# Altium footprint library IC.PCBLIB: 359 footprints (part 2 of 23) (continued)
## BGA208X17-0.8-TF [mil] (continued)
TopOverlay:
  circle w9.84: c-68.9,0 r4.92
  lines w3.94: 232.28,-251.97 271.65,-251.97 ; 251.97,-271.65 251.97,-232.28
  lines w7.87: -43.31,3.94 -3.94,43.31 ; -43.31,-547.24 547.24,-547.24 547.24,43.31 -43.31,43.31 -43.31,-547.24

## BGA256X16-1.0 [mil]
height 50
pads (256):
  round 20 smd: A1(0,0) A2(39.37,0) A3(78.74,0) A4(118.11,0) A5(157.48,0) A6(196.85,0) A7(236.22,0) A8(275.59,0) A9(314.96,0) A10(354.33,0) A11(393.7,0) A12(433.07,0) A13(472.44,0) A14(511.81,0) A15(551.18,0) A16(590.55,0) B1(0,-39.37) B2(39.37,-39.37) B3(78.74,-39.37) B4(118.11,-39.37) B5(157.48,-39.37) B6(196.85,-39.37) B7(236.22,-39.37) B8(275.59,-39.37) B9(314.96,-39.37) B10(354.33,-39.37) B11(393.7,-39.37) B12(433.07,-39.37) B13(472.44,-39.37) B14(511.81,-39.37) B15(551.18,-39.37) B16(590.55,-39.37) C1(0,-78.74) C2(39.37,-78.74) C3(78.74,-78.74) C4(118.11,-78.74) C5(157.48,-78.74) C6(196.85,-78.74) C7(236.22,-78.74) C8(275.59,-78.74) C9(314.96,-78.74) C10(354.33,-78.74) C11(393.7,-78.74) C12(433.07,-78.74) C13(472.44,-78.74) C14(511.81,-78.74) C15(551.18,-78.74) C16(590.55,-78.74) D1(0,-118.11) D2(39.37,-118.11) D3(78.74,-118.11) D4(118.11,-118.11) D5(157.48,-118.11) D6(196.85,-118.11) D7(236.22,-118.11) D8(275.59,-118.11) D9(314.96,-118.11) D10(354.33,-118.11) D11(393.7,-118.11) D12(433.07,-118.11) D13(472.44,-118.11) D14(511.81,-118.11) D15(551.18,-118.11) D16(590.55,-118.11) E1(0,-157.48) E2(39.37,-157.48) E3(78.74,-157.48) E4(118.11,-157.48) E5(157.48,-157.48) E6(196.85,-157.48) E7(236.22,-157.48) E8(275.59,-157.48) E9(314.96,-157.48) E10(354.33,-157.48) E11(393.7,-157.48) E12(433.07,-157.48) E13(472.44,-157.48) E14(511.81,-157.48) E15(551.18,-157.48) E16(590.55,-157.48) F1(0,-196.85) F2(39.37,-196.85) F3(78.74,-196.85) F4(118.11,-196.85) F5(157.48,-196.85) F6(196.85,-196.85) F7(236.22,-196.85) F8(275.59,-196.85) F9(314.96,-196.85) F10(354.33,-196.85) F11(393.7,-196.85) F12(433.07,-196.85) F13(472.44,-196.85) F14(511.81,-196.85) F15(551.18,-196.85) F16(590.55,-196.85) G1(0,-236.22) G2(39.37,-236.22) G3(78.74,-236.22) G4(118.11,-236.22) G5(157.48,-236.22) G6(196.85,-236.22) G7(236.22,-236.22) G8(275.59,-236.22) G9(314.96,-236.22) G10(354.33,-236.22) G11(393.7,-236.22) G12(433.07,-236.22) G13(472.44,-236.22) G14(511.81,-236.22) G15(551.18,-236.22) G16(590.55,-236.22) H1(0,-275.59) H2(39.37,-275.59) H3(78.74,-275.59) H4(118.11,-275.59) H5(157.48,-275.59) H6(196.85,-275.59) H7(236.22,-275.59) H8(275.59,-275.59) H9(314.96,-275.59) H10(354.33,-275.59) H11(393.7,-275.59) H12(433.07,-275.59) H13(472.44,-275.59) H14(511.81,-275.59) H15(551.18,-275.59) H16(590.55,-275.59) J1(0,-314.96) J2(39.37,-314.96) J3(78.74,-314.96) J4(118.11,-314.96) J5(157.48,-314.96) J6(196.85,-314.96) J7(236.22,-314.96) J8(275.59,-314.96) J9(314.96,-314.96) J10(354.33,-314.96) J11(393.7,-314.96) J12(433.07,-314.96) J13(472.44,-314.96) J14(511.81,-314.96) J15(551.18,-314.96) J16(590.55,-314.96) K1(0,-354.33) K2(39.37,-354.33) K3(78.74,-354.33) K4(118.11,-354.33) K5(157.48,-354.33) K6(196.85,-354.33) K7(236.22,-354.33) K8(275.59,-354.33) K9(314.96,-354.33) K10(354.33,-354.33) K11(393.7,-354.33) K12(433.07,-354.33) K13(472.44,-354.33) K14(511.81,-354.33) K15(551.18,-354.33) K16(590.55,-354.33) L1(0,-393.7) L2(39.37,-393.7) L3(78.74,-393.7) L4(118.11,-393.7) L5(157.48,-393.7) L6(196.85,-393.7) L7(236.22,-393.7) L8(275.59,-393.7) L9(314.96,-393.7) L10(354.33,-393.7) L11(393.7,-393.7) L12(433.07,-393.7) L13(472.44,-393.7) L14(511.81,-393.7) L15(551.18,-393.7) L16(590.55,-393.7) M1(0,-433.07) M2(39.37,-433.07) M3(78.74,-433.07) M4(118.11,-433.07) M5(157.48,-433.07) M6(196.85,-433.07) M7(236.22,-433.07) M8(275.59,-433.07) M9(314.96,-433.07) M10(354.33,-433.07) M11(393.7,-433.07) M12(433.07,-433.07) M13(472.44,-433.07) M14(511.81,-433.07) M15(551.18,-433.07) M16(590.55,-433.07) N1(0,-472.44) N2(39.37,-472.44) N3(78.74,-472.44) N4(118.11,-472.44) N5(157.48,-472.44) N6(196.85,-472.44) N7(236.22,-472.44) N8(275.59,-472.44) N9(314.96,-472.44) N10(354.33,-472.44) N11(393.7,-472.44) N12(433.07,-472.44) N13(472.44,-472.44) N14(511.81,-472.44) N15(551.18,-472.44) N16(590.55,-472.44) P1(0,-511.81) P2(39.37,-511.81) P3(78.74,-511.81) P4(118.11,-511.81) P5(157.48,-511.81) P6(196.85,-511.81) P7(236.22,-511.81) P8(275.59,-511.81) P9(314.96,-511.81) P10(354.33,-511.81) P11(393.7,-511.81) P12(433.07,-511.81) P13(472.44,-511.81) P14(511.81,-511.81) P15(551.18,-511.81) P16(590.55,-511.81) R1(0,-551.18) R2(39.37,-551.18) R3(78.74,-551.18) R4(118.11,-551.18) R5(157.48,-551.18) R6(196.85,-551.18) R7(236.22,-551.18) R8(275.59,-551.18) R9(314.96,-551.18) R10(354.33,-551.18) R11(393.7,-551.18) R12(433.07,-551.18) R13(472.44,-551.18) R14(511.81,-551.18) R15(551.18,-551.18) R16(590.55,-551.18) T1(0,-590.55) T2(39.37,-590.55) T3(78.74,-590.55) T4(118.11,-590.55) T5(157.48,-590.55) T6(196.85,-590.55) T7(236.22,-590.55) T8(275.59,-590.55) T9(314.96,-590.55) T10(354.33,-590.55) T11(393.7,-590.55) T12(433.07,-590.55) T13(472.44,-590.55) T14(511.81,-590.55) T15(551.18,-590.55) T16(590.55,-590.55)
TopOverlay:
  lines w8: -65,-590 -50,-590 ; 0,-655 0,-640 ; 0,50 0,70 ; 590,50 590,65 ; 590.55,-660 590.55,-640 ; 645,-590.55 660,-590.55 ; 645,0 660,0
  lines w10: -100,0 -53,0 ; -74,-13 -53,0 ; -74,13 -53,0 ; -39.37,-629.92 629.92,-629.92 629.92,39.37 -19.68,39.37 -39.37,19.68 -39.37,-629.92

## BGA272X17-0.8 [mm]
height 1.27
pads (272):
  round 0.45 smd: A1(0,0) A2(0.8,0) A3(1.6,0) A4(2.4,0) A5(3.2,0) A6(4,0) A7(4.8,0) A8(5.6,0) A9(6.4,0) A10(7.2,0) A11(8,0) A12(8.8,0) A13(9.6,0) A14(10.4,0) A15(11.2,0) A16(12,0) A17(12.8,0) B1(0,-0.8) B2(0.8,-0.8) B3(1.6,-0.8) B4(2.4,-0.8) B5(3.2,-0.8) B6(4,-0.8) B7(4.8,-0.8) B8(5.6,-0.8) B9(6.4,-0.8) B10(7.2,-0.8) B11(8,-0.8) B12(8.8,-0.8) B13(9.6,-0.8) B14(10.4,-0.8) B15(11.2,-0.8) B16(12,-0.8) B17(12.8,-0.8) C1(0,-1.6) C2(0.8,-1.6) C3(1.6,-1.6) C4(2.4,-1.6) C5(3.2,-1.6) C6(4,-1.6) C7(4.8,-1.6) C8(5.6,-1.6) C9(6.4,-1.6) C10(7.2,-1.6) C11(8,-1.6) C12(8.8,-1.6) C13(9.6,-1.6) C14(10.4,-1.6) C15(11.2,-1.6) C16(12,-1.6) C17(12.8,-1.6) D1(0,-2.4) D2(0.8,-2.4) D3(1.6,-2.4) D4(2.4,-2.4) D5(3.2,-2.4) D6(4,-2.4) D7(4.8,-2.4) D8(5.6,-2.4) D9(6.4,-2.4) D10(7.2,-2.4) D11(8,-2.4) D12(8.8,-2.4) D13(9.6,-2.4) D14(10.4,-2.4) D15(11.2,-2.4) D16(12,-2.4) D17(12.8,-2.4) E1(0,-3.2) E2(0.8,-3.2) E3(1.6,-3.2) E4(2.4,-3.2) E5(3.2,-3.2) E6(4,-3.2) E7(4.8,-3.2) E8(5.6,-3.2) E9(6.4,-3.2) E10(7.2,-3.2) E11(8,-3.2) E12(8.8,-3.2) E13(9.6,-3.2) E14(10.4,-3.2) E15(11.2,-3.2) E16(12,-3.2) E17(12.8,-3.2) F1(0,-4) F2(0.8,-4) F3(1.6,-4) F4(2.4,-4) F5(3.2,-4) F6(4,-4) F7(4.8,-4) F8(5.6,-4) F9(6.4,-4) F10(7.2,-4) F11(8,-4) F12(8.8,-4) F13(9.6,-4) F14(10.4,-4) F15(11.2,-4) F16(12,-4) F17(12.8,-4) G1(0,-4.8) G2(0.8,-4.8) G3(1.6,-4.8) G4(2.4,-4.8) G5(3.2,-4.8) G6(4,-4.8) G7(4.8,-4.8) G9(6.4,-4.8) G11(8,-4.8) G12(8.8,-4.8) G13(9.6,-4.8) G14(10.4,-4.8) G15(11.2,-4.8) G16(12,-4.8) G17(12.8,-4.8) H1(0,-5.6) H2(0.8,-5.6) H3(1.6,-5.6) H4(2.4,-5.6) H5(3.2,-5.6) H6(4,-5.6) H12(8.8,-5.6) H13(9.6,-5.6) H14(10.4,-5.6) H15(11.2,-5.6) H16(12,-5.6) H17(12.8,-5.6) J1(0,-6.4) J2(0.8,-6.4) J3(1.6,-6.4) J4(2.4,-6.4) J5(3.2,-6.4) J6(4,-6.4) J7(4.8,-6.4) J11(8,-6.4) J12(8.8,-6.4) J13(9.6,-6.4) J14(10.4,-6.4) J15(11.2,-6.4) J16(12,-6.4) J17(12.8,-6.4) K1(0,-7.2) K2(0.8,-7.2) K3(1.6,-7.2) K4(2.4,-7.2) K5(3.2,-7.2) K6(4,-7.2) K12(8.8,-7.2) K13(9.6,-7.2) K14(10.4,-7.2) K15(11.2,-7.2) K16(12,-7.2) K17(12.8,-7.2) L1(0,-8) L2(0.8,-8) L3(1.6,-8) L4(2.4,-8) L5(3.2,-8) L6(4,-8) L7(4.8,-8) L9(6.4,-8) L11(8,-8) L12(8.8,-8) L13(9.6,-8) L14(10.4,-8) L15(11.2,-8) L16(12,-8) L17(12.8,-8) M1(0,-8.8) M2(0.8,-8.8) M3(1.6,-8.8) M4(2.4,-8.8) M5(3.2,-8.8) M6(4,-8.8) M7(4.8,-8.8) M8(5.6,-8.8) M9(6.4,-8.8) M10(7.2,-8.8) M11(8,-8.8) M12(8.8,-8.8) M13(9.6,-8.8) M14(10.4,-8.8) M15(11.2,-8.8) M16(12,-8.8) M17(12.8,-8.8) N1(0,-9.6) N2(0.8,-9.6) N3(1.6,-9.6) N4(2.4,-9.6) N5(3.2,-9.6) N6(4,-9.6) N7(4.8,-9.6) N8(5.6,-9.6) N9(6.4,-9.6) N10(7.2,-9.6) N11(8,-9.6) N12(8.8,-9.6) N13(9.6,-9.6) N14(10.4,-9.6) N15(11.2,-9.6) N16(12,-9.6) N17(12.8,-9.6) P1(0,-10.4) P2(0.8,-10.4) P3(1.6,-10.4) P4(2.4,-10.4) P5(3.2,-10.4) P6(4,-10.4) P7(4.8,-10.4) P8(5.6,-10.4) P9(6.4,-10.4) P10(7.2,-10.4) P11(8,-10.4) P12(8.8,-10.4) P13(9.6,-10.4) P14(10.4,-10.4) P15(11.2,-10.4) P16(12,-10.4) P17(12.8,-10.4) R1(0,-11.2) R2(0.8,-11.2) R3(1.6,-11.2) R4(2.4,-11.2) R5(3.2,-11.2) R6(4,-11.2) R7(4.8,-11.2) R8(5.6,-11.2) R9(6.4,-11.2) R10(7.2,-11.2) R11(8,-11.2) R12(8.8,-11.2) R13(9.6,-11.2) R14(10.4,-11.2) R15(11.2,-11.2) R16(12,-11.2) R17(12.8,-11.2) T1(0,-12) T2(0.8,-12) T3(1.6,-12) T4(2.4,-12) T5(3.2,-12) T6(4,-12) T7(4.8,-12) T8(5.6,-12) T9(6.4,-12) T10(7.2,-12) T11(8,-12) T12(8.8,-12) T13(9.6,-12) T14(10.4,-12) T15(11.2,-12) T16(12,-12) T17(12.8,-12) U1(0,-12.8) U2(0.8,-12.8) U3(1.6,-12.8) U4(2.4,-12.8) U5(3.2,-12.8) U6(4,-12.8) U7(4.8,-12.8) U8(5.6,-12.8) U9(6.4,-12.8) U10(7.2,-12.8) U11(8,-12.8) U12(8.8,-12.8) U13(9.6,-12.8) U14(10.4,-12.8) U15(11.2,-12.8) U16(12,-12.8) U17(12.8,-12.8)
TopOverlay:
  lines w0.203: -1.524,0 -1.043,0 ; -1.297,-12.8 -1.043,-12.8 ; -1.27,-0.227 -1.043,0 ; -1.27,0.227 -1.043,0 ; -0.8,0.4 -0.4,0.8 ; 0,-14.097 0,-13.843 ; 0,1.043 0,1.297 ; 12.8,-14.097 12.8,-13.843 ; 12.8,1.043 12.8,1.297 ; 13.843,-12.8 14.097,-12.8 ; 13.843,0 14.097,0 ; -0.4,0.8 -0.8,0.8 -0.8,-13.6 13.6,-13.6 13.6,0.8 -0.4,0.8

## BGA288X22-1.0 [mm]
height 1.524
pads (288):
  round 0.5 smd: A1(0,0) A2(1,0) A3(2,0) A4(3,0) A5(4,0) A6(5,0) A7(6,0) A8(7,0) A9(8,0) A10(9,0) A11(10,0) A12(11,0) A13(12,0) A14(13,0) A15(14,0) A16(15,0) A17(16,0) A18(17,0) A19(18,0) A20(19,0) A21(20,0) A22(21,0) AA1(0,-20) AA2(1,-20) AA3(2,-20) AA4(3,-20) AA5(4,-20) AA6(5,-20) AA7(6,-20) AA8(7,-20) AA9(8,-20) AA10(9,-20) AA11(10,-20) AA12(11,-20) AA13(12,-20) AA14(13,-20) AA15(14,-20) AA16(15,-20) AA17(16,-20) AA18(17,-20) AA19(18,-20) AA20(19,-20) AA21(20,-20) AA22(21,-20) AB1(0,-21) AB2(1,-21) AB3(2,-21) AB4(3,-21) AB5(4,-21) AB6(5,-21) AB7(6,-21) AB8(7,-21) AB9(8,-21) AB10(9,-21) AB11(10,-21) AB12(11,-21) AB13(12,-21) AB14(13,-21) AB15(14,-21) AB16(15,-21) AB17(16,-21) AB18(17,-21) AB19(18,-21) AB20(19,-21) AB21(20,-21) AB22(21,-21) B1(0,-1) B2(1,-1) B3(2,-1) B4(3,-1) B5(4,-1) B6(5,-1) B7(6,-1) B8(7,-1) B9(8,-1) B10(9,-1) B11(10,-1) B12(11,-1) B13(12,-1) B14(13,-1) B15(14,-1) B16(15,-1) B17(16,-1) B18(17,-1) B19(18,-1) B20(19,-1) B21(20,-1) B22(21,-1) C1(0,-2) C2(1,-2) C3(2,-2) C4(3,-2) C5(4,-2) C6(5,-2) C7(6,-2) C8(7,-2) C9(8,-2) C10(9,-2) C11(10,-2) C12(11,-2) C13(12,-2) C14(13,-2) C15(14,-2) C16(15,-2) C17(16,-2) C18(17,-2) C19(18,-2) C20(19,-2) C21(20,-2) C22(21,-2) D1(0,-3) D2(1,-3) D3(2,-3) D4(3,-3) D5(4,-3) D6(5,-3) D7(6,-3) D8(7,-3) D9(8,-3) D10(9,-3) D11(10,-3) D12(11,-3) D13(12,-3) D14(13,-3) D15(14,-3) D16(15,-3) D17(16,-3) D18(17,-3) D19(18,-3) D20(19,-3) D21(20,-3) D22(21,-3) E1(0,-4) E2(1,-4) E3(2,-4) E4(3,-4) E19(18,-4) E20(19,-4) E21(20,-4) E22(21,-4) F1(0,-5) F2(1,-5) F3(2,-5) F4(3,-5) F19(18,-5) F20(19,-5) F21(20,-5) F22(21,-5) G1(0,-6) G2(1,-6) G3(2,-6) G4(3,-6) G19(18,-6) G20(19,-6) G21(20,-6) G22(21,-6) H1(0,-7) H2(1,-7) H3(2,-7) H4(3,-7) H19(18,-7) H20(19,-7) H21(20,-7) H22(21,-7) J1(0,-8) J2(1,-8) J3(2,-8) J4(3,-8) J19(18,-8) J20(19,-8) J21(20,-8) J22(21,-8) K1(0,-9) K2(1,-9) K3(2,-9) K4(3,-9) K19(18,-9) K20(19,-9) K21(20,-9) K22(21,-9) L1(0,-10) L2(1,-10) L3(2,-10) L4(3,-10) L19(18,-10) L20(19,-10) L21(20,-10) L22(21,-10) M1(0,-11) M2(1,-11) M3(2,-11) M4(3,-11) M19(18,-11) M20(19,-11) M21(20,-11) M22(21,-11) N1(0,-12) N2(1,-12) N3(2,-12) N4(3,-12) N19(18,-12) N20(19,-12) N21(20,-12) N22(21,-12) P1(0,-13) P2(1,-13) P3(2,-13) P4(3,-13) P19(18,-13) P20(19,-13) P21(20,-13) P22(21,-13) R1(0,-14) R2(1,-14) R3(2,-14) R4(3,-14) R19(18,-14) R20(19,-14) R21(20,-14) R22(21,-14) T1(0,-15) T2(1,-15) T3(2,-15) T4(3,-15) T19(18,-15) T20(19,-15) T21(20,-15) T22(21,-15) U1(0,-16) U2(1,-16) U3(2,-16) U4(3,-16) U19(18,-16) U20(19,-16) U21(20,-16) U22(21,-16) V1(0,-17) V2(1,-17) V3(2,-17) V4(3,-17) V19(18,-17) V20(19,-17) V21(20,-17) V22(21,-17) W1(0,-18) W2(1,-18) W3(2,-18) W4(3,-18) W5(4,-18) W6(5,-18) W7(6,-18) W8(7,-18) W9(8,-18) W10(9,-18) W11(10,-18) W12(11,-18) W13(12,-18) W14(13,-18) W15(14,-18) W16(15,-18) W17(16,-18) W18(17,-18) W19(18,-18) W20(19,-18) W21(20,-18) W22(21,-18) Y1(0,-19) Y2(1,-19) Y3(2,-19) Y4(3,-19) Y5(4,-19) Y6(5,-19) Y7(6,-19) Y8(7,-19) Y9(8,-19) Y10(9,-19) Y11(10,-19) Y12(11,-19) Y13(12,-19) Y14(13,-19) Y15(14,-19) Y16(15,-19) Y17(16,-19) Y18(17,-19) Y19(18,-19) Y20(19,-19) Y21(20,-19) Y22(21,-19)
TopOverlay:
  circle w0.25: c-1.65,0 r0.125
  region: -0.235,1 -0.381,1 -0.381,0.765 -0.235,0.765
  region: -0.254,1 -0.635,1 -0.635,0.635 -0.254,0.635
  region: -0.508,1 -1,1 -1,0.381 -0.508,0.381
  region: -0.762,1 -1,1 -1,0.173 -0.762,0.173
  lines w0.2: -1,0 0,1 ; 21,-22 22,-22 22,0 ; 21,-22 -1,-22 -1,1 22,1 22,0 ; 21,-22 21,-22 ; 22,0 22,0

## BGA289X17-0.8 [mm]
height 1.27
pads (289):
  round 0.4 smd: A1(0,0) A2(0.8,0) A3(1.6,0) A4(2.4,0) A5(3.2,0) A6(4,0) A7(4.8,0) A8(5.6,0) A9(6.4,0) A10(7.2,0) A11(8,0) A12(8.8,0) A13(9.6,0) A14(10.4,0) A15(11.2,0) A16(12,0) A17(12.8,0) B1(0,-0.8) B2(0.8,-0.8) B3(1.6,-0.8) B4(2.4,-0.8) B5(3.2,-0.8) B6(4,-0.8) B7(4.8,-0.8) B8(5.6,-0.8) B9(6.4,-0.8) B10(7.2,-0.8) B11(8,-0.8) B12(8.8,-0.8) B13(9.6,-0.8) B14(10.4,-0.8) B15(11.2,-0.8) B16(12,-0.8) B17(12.8,-0.8) C1(0,-1.6) C2(0.8,-1.6) C3(1.6,-1.6) C4(2.4,-1.6) C5(3.2,-1.6) C6(4,-1.6) C7(4.8,-1.6) C8(5.6,-1.6) C9(6.4,-1.6) C10(7.2,-1.6) C11(8,-1.6) C12(8.8,-1.6) C13(9.6,-1.6) C14(10.4,-1.6) C15(11.2,-1.6) C16(12,-1.6) C17(12.8,-1.6) D1(0,-2.4) D2(0.8,-2.4) D3(1.6,-2.4) D4(2.4,-2.4) D5(3.2,-2.4) D6(4,-2.4) D7(4.8,-2.4) D8(5.6,-2.4) D9(6.4,-2.4) D10(7.2,-2.4) D11(8,-2.4) D12(8.8,-2.4) D13(9.6,-2.4) D14(10.4,-2.4) D15(11.2,-2.4) D16(12,-2.4) D17(12.8,-2.4) E1(0,-3.2) E2(0.8,-3.2) E3(1.6,-3.2) E4(2.4,-3.2) E5(3.2,-3.2) E6(4,-3.2) E7(4.8,-3.2) E8(5.6,-3.2) E9(6.4,-3.2) E10(7.2,-3.2) E11(8,-3.2) E12(8.8,-3.2) E13(9.6,-3.2) E14(10.4,-3.2) E15(11.2,-3.2) E16(12,-3.2) E17(12.8,-3.2) F1(0,-4) F2(0.8,-4) F3(1.6,-4) F4(2.4,-4) F5(3.2,-4) F6(4,-4) F7(4.8,-4) F8(5.6,-4) F9(6.4,-4) F10(7.2,-4) F11(8,-4) F12(8.8,-4) F13(9.6,-4) F14(10.4,-4) F15(11.2,-4) F16(12,-4) F17(12.8,-4) G1(0,-4.8) G2(0.8,-4.8) G3(1.6,-4.8) G4(2.4,-4.8) G5(3.2,-4.8) G6(4,-4.8) G7(4.8,-4.8) G8(5.6,-4.8) G9(6.4,-4.8) G10(7.2,-4.8) G11(8,-4.8) G12(8.8,-4.8) G13(9.6,-4.8) G14(10.4,-4.8) G15(11.2,-4.8) G16(12,-4.8) G17(12.8,-4.8) H1(0,-5.6) H2(0.8,-5.6) H3(1.6,-5.6) H4(2.4,-5.6) H5(3.2,-5.6) H6(4,-5.6) H7(4.8,-5.6) H8(5.6,-5.6) H9(6.4,-5.6) H10(7.2,-5.6) H11(8,-5.6) H12(8.8,-5.6) H13(9.6,-5.6) H14(10.4,-5.6) H15(11.2,-5.6) H16(12,-5.6) H17(12.8,-5.6) J1(0,-6.4) J2(0.8,-6.4) J3(1.6,-6.4) J4(2.4,-6.4) J5(3.2,-6.4) J6(4,-6.4) J7(4.8,-6.4) J8(5.6,-6.4) J9(6.4,-6.4) J10(7.2,-6.4) J11(8,-6.4) J12(8.8,-6.4) J13(9.6,-6.4) J14(10.4,-6.4) J15(11.2,-6.4) J16(12,-6.4) J17(12.8,-6.4) K1(0,-7.2) K2(0.8,-7.2) K3(1.6,-7.2) K4(2.4,-7.2) K5(3.2,-7.2) K6(4,-7.2) K7(4.8,-7.2) K8(5.6,-7.2) K9(6.4,-7.2) K10(7.2,-7.2) K11(8,-7.2) K12(8.8,-7.2) K13(9.6,-7.2) K14(10.4,-7.2) K15(11.2,-7.2) K16(12,-7.2) K17(12.8,-7.2) L1(0,-8) L2(0.8,-8) L3(1.6,-8) L4(2.4,-8) L5(3.2,-8) L6(4,-8) L7(4.8,-8) L8(5.6,-8) L9(6.4,-8) L10(7.2,-8) L11(8,-8) L12(8.8,-8) L13(9.6,-8) L14(10.4,-8) L15(11.2,-8) L16(12,-8) L17(12.8,-8) M1(0,-8.8) M2(0.8,-8.8) M3(1.6,-8.8) M4(2.4,-8.8) M5(3.2,-8.8) M6(4,-8.8) M7(4.8,-8.8) M8(5.6,-8.8) M9(6.4,-8.8) M10(7.2,-8.8) M11(8,-8.8) M12(8.8,-8.8) M13(9.6,-8.8) M14(10.4,-8.8) M15(11.2,-8.8) M16(12,-8.8) M17(12.8,-8.8) N1(0,-9.6) N2(0.8,-9.6) N3(1.6,-9.6) N4(2.4,-9.6) N5(3.2,-9.6) N6(4,-9.6) N7(4.8,-9.6) N8(5.6,-9.6) N9(6.4,-9.6) N10(7.2,-9.6) N11(8,-9.6) N12(8.8,-9.6) N13(9.6,-9.6) N14(10.4,-9.6) N15(11.2,-9.6) N16(12,-9.6) N17(12.8,-9.6) P1(0,-10.4) P2(0.8,-10.4) P3(1.6,-10.4) P4(2.4,-10.4) P5(3.2,-10.4) P6(4,-10.4) P7(4.8,-10.4) P8(5.6,-10.4) P9(6.4,-10.4) P10(7.2,-10.4) P11(8,-10.4) P12(8.8,-10.4) P13(9.6,-10.4) P14(10.4,-10.4) P15(11.2,-10.4) P16(12,-10.4) P17(12.8,-10.4) R1(0,-11.2) R2(0.8,-11.2) R3(1.6,-11.2) R4(2.4,-11.2) R5(3.2,-11.2) R6(4,-11.2) R7(4.8,-11.2) R8(5.6,-11.2) R9(6.4,-11.2) R10(7.2,-11.2) R11(8,-11.2) R12(8.8,-11.2) R13(9.6,-11.2) R14(10.4,-11.2) R15(11.2,-11.2) R16(12,-11.2) R17(12.8,-11.2) T1(0,-12) T2(0.8,-12) T3(1.6,-12) T4(2.4,-12) T5(3.2,-12) T6(4,-12) T7(4.8,-12) T8(5.6,-12) T9(6.4,-12) T10(7.2,-12) T11(8,-12) T12(8.8,-12) T13(9.6,-12) T14(10.4,-12) T15(11.2,-12) T16(12,-12) T17(12.8,-12) U1(0,-12.8) U2(0.8,-12.8) U3(1.6,-12.8) U4(2.4,-12.8) U5(3.2,-12.8) U6(4,-12.8) U7(4.8,-12.8) U8(5.6,-12.8) U9(6.4,-12.8) U10(7.2,-12.8) U11(8,-12.8) U12(8.8,-12.8) U13(9.6,-12.8) U14(10.4,-12.8) U15(11.2,-12.8) U16(12,-12.8) U17(12.8,-12.8)
TopOverlay:
  lines w0.2: -0.8,-13.6 -0.8,0.4 -0.4,0.8 13.6,0.8 13.6,-13.6 -0.8,-13.6
  lines w0.203: -2.248,0 -1.219,0 ; -1.803,-12.8 -0.8,-12.8 ; -1.626,-0.406 -1.219,0 ; -1.6,0.381 -1.219,0 ; 0,-14.629 0,-13.6 ; 0,0.8 0,1.803 ; 12.8,-14.603 12.8,-13.6 ; 12.8,0.8 12.8,1.829 ; 13.6,-12.8 14.629,-12.8 ; 13.6,0 14.603,0

## BGA296X18-0.8-TF [mm]
height 1.778
pads (296):
  round 0.45 smd: A3(0,0) A4(0.8,0) A5(1.6,0) A6(2.4,0) A7(3.2,0) A8(4,0) A9(4.8,0) A10(5.6,0) A11(6.4,0) A12(7.2,0) A13(8,0) A14(8.8,0) A15(9.6,0) A16(10.4,0) B2(-0.8,-0.8) B3(0,-0.8) B4(0.8,-0.8) B5(1.6,-0.8) B6(2.4,-0.8) B7(3.2,-0.8) B8(4,-0.8) B9(4.8,-0.8) B10(5.6,-0.8) B11(6.4,-0.8) B12(7.2,-0.8) B13(8,-0.8) B14(8.8,-0.8) B15(9.6,-0.8) B16(10.4,-0.8) B17(11.2,-0.8) C1(-1.6,-1.6) C2(-0.8,-1.6) C3(0,-1.6) C4(0.8,-1.6) C5(1.6,-1.6) C6(2.4,-1.6) C7(3.2,-1.6) C8(4,-1.6) C9(4.8,-1.6) C10(5.6,-1.6) C11(6.4,-1.6) C12(7.2,-1.6) C13(8,-1.6) C14(8.8,-1.6) C15(9.6,-1.6) C16(10.4,-1.6) C17(11.2,-1.6) C18(12,-1.6) D1(-1.6,-2.4) D2(-0.8,-2.4) D3(0,-2.4) D4(0.8,-2.4) D5(1.6,-2.4) D6(2.4,-2.4) D7(3.2,-2.4) D8(4,-2.4) D9(4.8,-2.4) D10(5.6,-2.4) D11(6.4,-2.4) D12(7.2,-2.4) D13(8,-2.4) D14(8.8,-2.4) D15(9.6,-2.4) D16(10.4,-2.4) D17(11.2,-2.4) D18(12,-2.4) E1(-1.6,-3.2) E2(-0.8,-3.2) E3(0,-3.2) E4(0.8,-3.2) E5(1.6,-3.2) E6(2.4,-3.2) E7(3.2,-3.2) E8(4,-3.2) E9(4.8,-3.2) E10(5.6,-3.2) E11(6.4,-3.2) E12(7.2,-3.2) E13(8,-3.2) E14(8.8,-3.2) E15(9.6,-3.2) E16(10.4,-3.2) E17(11.2,-3.2) E18(12,-3.2) F1(-1.6,-4) F2(-0.8,-4) F3(0,-4) F4(0.8,-4) F5(1.6,-4) F6(2.4,-4) F7(3.2,-4) F8(4,-4) F9(4.8,-4) F10(5.6,-4) F11(6.4,-4) F12(7.2,-4) F13(8,-4) F14(8.8,-4) F15(9.6,-4) F16(10.4,-4) F17(11.2,-4) F18(12,-4) G1(-1.6,-4.8) G2(-0.8,-4.8) G3(0,-4.8) G4(0.8,-4.8) G5(1.6,-4.8) G6(2.4,-4.8) G7(3.2,-4.8) G8(4,-4.8) G9(4.8,-4.8) G10(5.6,-4.8) G11(6.4,-4.8) G12(7.2,-4.8) G13(8,-4.8) G14(8.8,-4.8) G15(9.6,-4.8) G16(10.4,-4.8) G17(11.2,-4.8) G18(12,-4.8) H1(-1.6,-5.6) H2(-0.8,-5.6) H3(0,-5.6) H4(0.8,-5.6) H5(1.6,-5.6) H6(2.4,-5.6) H7(3.2,-5.6) H12(7.2,-5.6) H13(8,-5.6) H14(8.8,-5.6) H15(9.6,-5.6) H16(10.4,-5.6) H17(11.2,-5.6) H18(12,-5.6) J1(-1.6,-6.4) J2(-0.8,-6.4) J3(0,-6.4) J4(0.8,-6.4) J5(1.6,-6.4) J6(2.4,-6.4) J7(3.2,-6.4) J12(7.2,-6.4) J13(8,-6.4) J14(8.8,-6.4) J15(9.6,-6.4) J16(10.4,-6.4) J17(11.2,-6.4) J18(12,-6.4) K1(-1.6,-7.2) K2(-0.8,-7.2) K3(0,-7.2) K4(0.8,-7.2) K5(1.6,-7.2) K6(2.4,-7.2) K7(3.2,-7.2) K12(7.2,-7.2) K13(8,-7.2) K14(8.8,-7.2) K15(9.6,-7.2) K16(10.4,-7.2) K17(11.2,-7.2) K18(12,-7.2) L1(-1.6,-8) L2(-0.8,-8) L3(0,-8) L4(0.8,-8) L5(1.6,-8) L6(2.4,-8) L7(3.2,-8) L12(7.2,-8) L13(8,-8) L14(8.8,-8) L15(9.6,-8) L16(10.4,-8) L17(11.2,-8) L18(12,-8) M1(-1.6,-8.8) M2(-0.8,-8.8) M3(0,-8.8) M4(0.8,-8.8) M5(1.6,-8.8) M6(2.4,-8.8) M7(3.2,-8.8) M8(4,-8.8) M9(4.8,-8.8) M10(5.6,-8.8) M11(6.4,-8.8) M12(7.2,-8.8) M13(8,-8.8) M14(8.8,-8.8) M15(9.6,-8.8) M16(10.4,-8.8) M17(11.2,-8.8) M18(12,-8.8) N1(-1.6,-9.6) N2(-0.8,-9.6) N3(0,-9.6) N4(0.8,-9.6) N5(1.6,-9.6) N6(2.4,-9.6) N7(3.2,-9.6) N8(4,-9.6) N9(4.8,-9.6) N10(5.6,-9.6) N11(6.4,-9.6) N12(7.2,-9.6) N13(8,-9.6) N14(8.8,-9.6) N15(9.6,-9.6) N16(10.4,-9.6) N17(11.2,-9.6) N18(12,-9.6) P1(-1.6,-10.4) P2(-0.8,-10.4) P3(0,-10.4) P4(0.8,-10.4) P5(1.6,-10.4) P6(2.4,-10.4) P7(3.2,-10.4) P8(4,-10.4) P9(4.8,-10.4) P10(5.6,-10.4) P11(6.4,-10.4) P12(7.2,-10.4) P13(8,-10.4) P14(8.8,-10.4) P15(9.6,-10.4) P16(10.4,-10.4) P17(11.2,-10.4) P18(12,-10.4) R1(-1.6,-11.2) R2(-0.8,-11.2) R3(0,-11.2) R4(0.8,-11.2) R5(1.6,-11.2) R6(2.4,-11.2) R7(3.2,-11.2) R8(4,-11.2) R9(4.8,-11.2) R10(5.6,-11.2) R11(6.4,-11.2) R12(7.2,-11.2) R13(8,-11.2) R14(8.8,-11.2) R15(9.6,-11.2) R16(10.4,-11.2) R17(11.2,-11.2) R18(12,-11.2) T1(-1.6,-12) T2(-0.8,-12) T3(0,-12) T4(0.8,-12) T5(1.6,-12) T6(2.4,-12) T7(3.2,-12) T8(4,-12) T9(4.8,-12) T10(5.6,-12) T11(6.4,-12) T12(7.2,-12) T13(8,-12) T14(8.8,-12) T15(9.6,-12) T16(10.4,-12) T17(11.2,-12) T18(12,-12) U2(-0.8,-12.8) U3(0,-12.8) U4(0.8,-12.8) U5(1.6,-12.8) U6(2.4,-12.8) U7(3.2,-12.8) U8(4,-12.8) U9(4.8,-12.8) U10(5.6,-12.8) U11(6.4,-12.8) U12(7.2,-12.8) U13(8,-12.8) U14(8.8,-12.8) U15(9.6,-12.8) U16(10.4,-12.8) U17(11.2,-12.8) V3(0,-13.6) V4(0.8,-13.6) V5(1.6,-13.6) V6(2.4,-13.6) V7(3.2,-13.6) V8(4,-13.6) V9(4.8,-13.6) V10(5.6,-13.6) V11(6.4,-13.6) V12(7.2,-13.6) V13(8,-13.6) V14(8.8,-13.6) V15(9.6,-13.6) V16(10.4,-13.6)
TopOverlay:
  circle w1: c-3.055,1.277 r0.127
  lines w0.2: -3.57,-13.588 -2.642,-13.588 ; -3.544,0.001 -2.655,0.001 ; -1.601,-15.544 -1.601,-14.655 ; -1.588,1.042 -1.588,1.97 ; 11.988,-15.57 11.988,-14.642 ; 12.001,1.055 12.001,1.944 ; 13.042,-0.012 13.97,-0.012 ; 13.055,-13.601 13.944,-13.601 ; 12.75,-14.35 12.75,-14.35 ; 12.75,-14.35 12.75,0.75 -1.88,0.75 -2.35,0.28 -2.35,-14.35 12.75,-14.35
  text "1" at -4.579,-0.425 h0.89

## BGA297X21P-0.8 [mm]
height 1.27
pads (297):
  round 0.45 smd: A1(-8,8) A2(-7.2,8) A3(-6.4,8) A4(-5.6,8) A5(-4.8,8) A6(-4,8) A7(-3.2,8) A8(-2.4,8) A9(-1.6,8) A10(-0.8,8) A11(0,8) A12(0.8,8) A13(1.6,8) A14(2.4,8) A15(3.2,8) A16(4,8) A17(4.8,8) A18(5.6,8) A19(6.4,8) A20(7.2,8) A21(8,8) AA1(-8,-8) AA2(-7.2,-8) AA3(-6.4,-8) AA4(-5.6,-8) AA5(-4.8,-8) AA6(-4,-8) AA7(-3.2,-8) AA8(-2.4,-8) AA9(-1.6,-8) AA10(-0.8,-8) AA11(0,-8) AA12(0.8,-8) AA13(1.6,-8) AA14(2.4,-8) AA15(3.2,-8) AA16(4,-8) AA17(4.8,-8) AA18(5.6,-8) AA19(6.4,-8) AA20(7.2,-8) AA21(8,-8) B1(-8,7.2) B2(-7.2,7.2) B3(-6.4,7.2) B4(-5.6,7.2) B5(-4.8,7.2) B6(-4,7.2) B7(-3.2,7.2) B8(-2.4,7.2) B9(-1.6,7.2) B10(-0.8,7.2) B11(0,7.2) B12(0.8,7.2) B13(1.6,7.2) B14(2.4,7.2) B15(3.2,7.2) B16(4,7.2) B17(4.8,7.2) B18(5.6,7.2) B19(6.4,7.2) B20(7.2,7.2) B21(8,7.2) C1(-8,6.4) C2(-7.2,6.4) C3(-6.4,6.4) C4(-5.6,6.4) C5(-4.8,6.4) C6(-4,6.4) C7(-3.2,6.4) C8(-2.4,6.4) C9(-1.6,6.4) C10(-0.8,6.4) C11(0,6.4) C12(0.8,6.4) C13(1.6,6.4) C14(2.4,6.4) C15(3.2,6.4) C16(4,6.4) C17(4.8,6.4) C18(5.6,6.4) C19(6.4,6.4) C20(7.2,6.4) C21(8,6.4) D1(-8,5.6) D1(0,5.6) D2(-7.2,5.6) D3(-6.4,5.6) D4(-5.6,5.6) D5(-4.8,5.6) D6(-4,5.6) D7(-3.2,5.6) D8(-2.4,5.6) D9(-1.6,5.6) D10(-0.8,5.6) D12(0.8,5.6) D13(1.6,5.6) D14(2.4,5.6) D15(3.2,5.6) D16(4,5.6) D17(4.8,5.6) D18(5.6,5.6) D19(6.4,5.6) D20(7.2,5.6) D21(8,5.6) E1(-8,4.8) E2(-7.2,4.8) E3(-6.4,4.8) E4(-5.6,4.8) E18(5.6,4.8) E19(6.4,4.8) E20(7.2,4.8) E21(8,4.8) F1(-8,4) F2(-7.2,4) F3(-6.4,4) F4(-5.6,4) F18(5.6,4) F19(6.4,4) F20(7.2,4) F21(8,4) G1(-8,3.2) G2(-7.2,3.2) G3(-6.4,3.2) G4(-5.6,3.2) G18(5.6,3.2) G19(6.4,3.2) G20(7.2,3.2) G21(8,3.2) H1(-8,2.4) H2(-7.2,2.4) H3(-6.4,2.4) H4(-5.6,2.4) H18(5.6,2.4) H19(6.4,2.4) H20(7.2,2.4) H21(8,2.4) J1(-8,1.6) J2(-7.2,1.6) J3(-6.4,1.6) J4(-5.6,1.6) J9(-1.6,1.6) J10(-0.8,1.6) J11(0,1.6) J12(0.8,1.6) J13(1.6,1.6) J18(5.6,1.6) J19(6.4,1.6) J20(7.2,1.6) J21(8,1.6) K1(-8,0.8) K2(-7.2,0.8) K3(-6.4,0.8) K4(-5.6,0.8) K9(-1.6,0.8) K10(-0.8,0.8) K11(0,0.8) K12(0.8,0.8) K13(1.6,0.8) K18(5.6,0.8) K19(6.4,0.8) K20(7.2,0.8) K21(8,0.8) L1(-8,0) L2(-7.2,0) L3(-6.4,0) L4(-5.6,0) L9(-1.6,0) L10(-0.8,0) L11(0,0) L12(0.8,0) L13(1.6,0) L18(5.6,0) L19(6.4,0) L20(7.2,0) L21(8,0) M1(-8,-0.8) M2(-7.2,-0.8) M3(-6.4,-0.8) M4(-5.6,-0.8) M9(-1.6,-0.8) M10(-0.8,-0.8) M11(0,-0.8) M12(0.8,-0.8) M13(1.6,-0.8) M18(5.6,-0.8) M19(6.4,-0.8) M20(7.2,-0.8) M21(8,-0.8) N1(-8,-1.6) N2(-7.2,-1.6) N3(-6.4,-1.6) N4(-5.6,-1.6) N9(-1.6,-1.6) N10(-0.8,-1.6) N11(0,-1.6) N12(0.8,-1.6) N13(1.6,-1.6) N18(5.6,-1.6) N19(6.4,-1.6) N20(7.2,-1.6) N21(8,-1.6) P1(-8,-2.4) P2(-7.2,-2.4) P3(-6.4,-2.4) P4(-5.6,-2.4) P18(5.6,-2.4) P19(6.4,-2.4) P20(7.2,-2.4) P21(8,-2.4) R1(-8,-3.2) R2(-7.2,-3.2) R3(-6.4,-3.2) R4(-5.6,-3.2) R18(5.6,-3.2) R19(6.4,-3.2) R20(7.2,-3.2) R21(8,-3.2) T1(-8,-4) T2(-7.2,-4) T3(-6.4,-4) T4(-5.6,-4) T18(5.6,-4) T19(6.4,-4) T20(7.2,-4) T21(8,-4) U1(-8,-4.8) U2(-7.2,-4.8) U3(-6.4,-4.8) U4(-5.6,-4.8) U18(5.6,-4.8) U19(6.4,-4.8) U20(7.2,-4.8) U21(8,-4.8) V1(-8,-5.6) V2(-7.2,-5.6) V3(-6.4,-5.6) V4(-5.6,-5.6) V5(-4.8,-5.6) V6(-4,-5.6) V7(-3.2,-5.6) V8(-2.4,-5.6) V9(-1.6,-5.6) V10(-0.8,-5.6) V11(0,-5.6) V12(0.8,-5.6) V13(1.6,-5.6) V14(2.4,-5.6) V15(3.2,-5.6) V16(4,-5.6) V17(4.8,-5.6) V18(5.6,-5.6) V19(6.4,-5.6) V20(7.2,-5.6) V21(8,-5.6) W1(-8,-6.4) W2(-7.2,-6.4) W3(-6.4,-6.4) W4(-5.6,-6.4) W5(-4.8,-6.4) W6(-4,-6.4) W7(-3.2,-6.4) W8(-2.4,-6.4) W9(-1.6,-6.4) W10(-0.8,-6.4) W11(0,-6.4) W12(0.8,-6.4) W13(1.6,-6.4) W14(2.4,-6.4) W15(3.2,-6.4) W16(4,-6.4) W17(4.8,-6.4) W18(5.6,-6.4) W19(6.4,-6.4) W20(7.2,-6.4) W21(8,-6.4) Y1(-8,-7.2) Y2(-7.2,-7.2) Y3(-6.4,-7.2) Y4(-5.6,-7.2) Y5(-4.8,-7.2) Y6(-4,-7.2) Y7(-3.2,-7.2) Y8(-2.4,-7.2) Y9(-1.6,-7.2) Y10(-0.8,-7.2) Y11(0,-7.2) Y12(0.8,-7.2) Y13(1.6,-7.2) Y14(2.4,-7.2) Y15(3.2,-7.2) Y16(4,-7.2) Y17(4.8,-7.2) Y18(5.6,-7.2) Y19(6.4,-7.2) Y20(7.2,-7.2) Y21(8,-7.2)
TopOverlay:
  circle w0.762: c-10.718,9.803 r0.381
  lines w0.127: -10.743,-8 -9.727,-8 ; -10.743,8 -9.727,8 ; -8,-10.743 -8,-9.727 ; -8,9.727 -8,10.743 ; 8,-10.743 8,-9.727 ; 8,9.727 8,10.743 ; 9.727,-8 10.743,-8 ; 9.727,8 10.743,8
  lines w0.2: -9.5,-9.5 -9.5,9.5 9.5,9.5 9.5,-9.5 -9.5,-9.5
  text "A1" at -12.267,7.594 h0.89